# Altium schematic symbol library 13-Logicold 逻辑 IC.SchLib: 297 symbols (part 9 of 30)
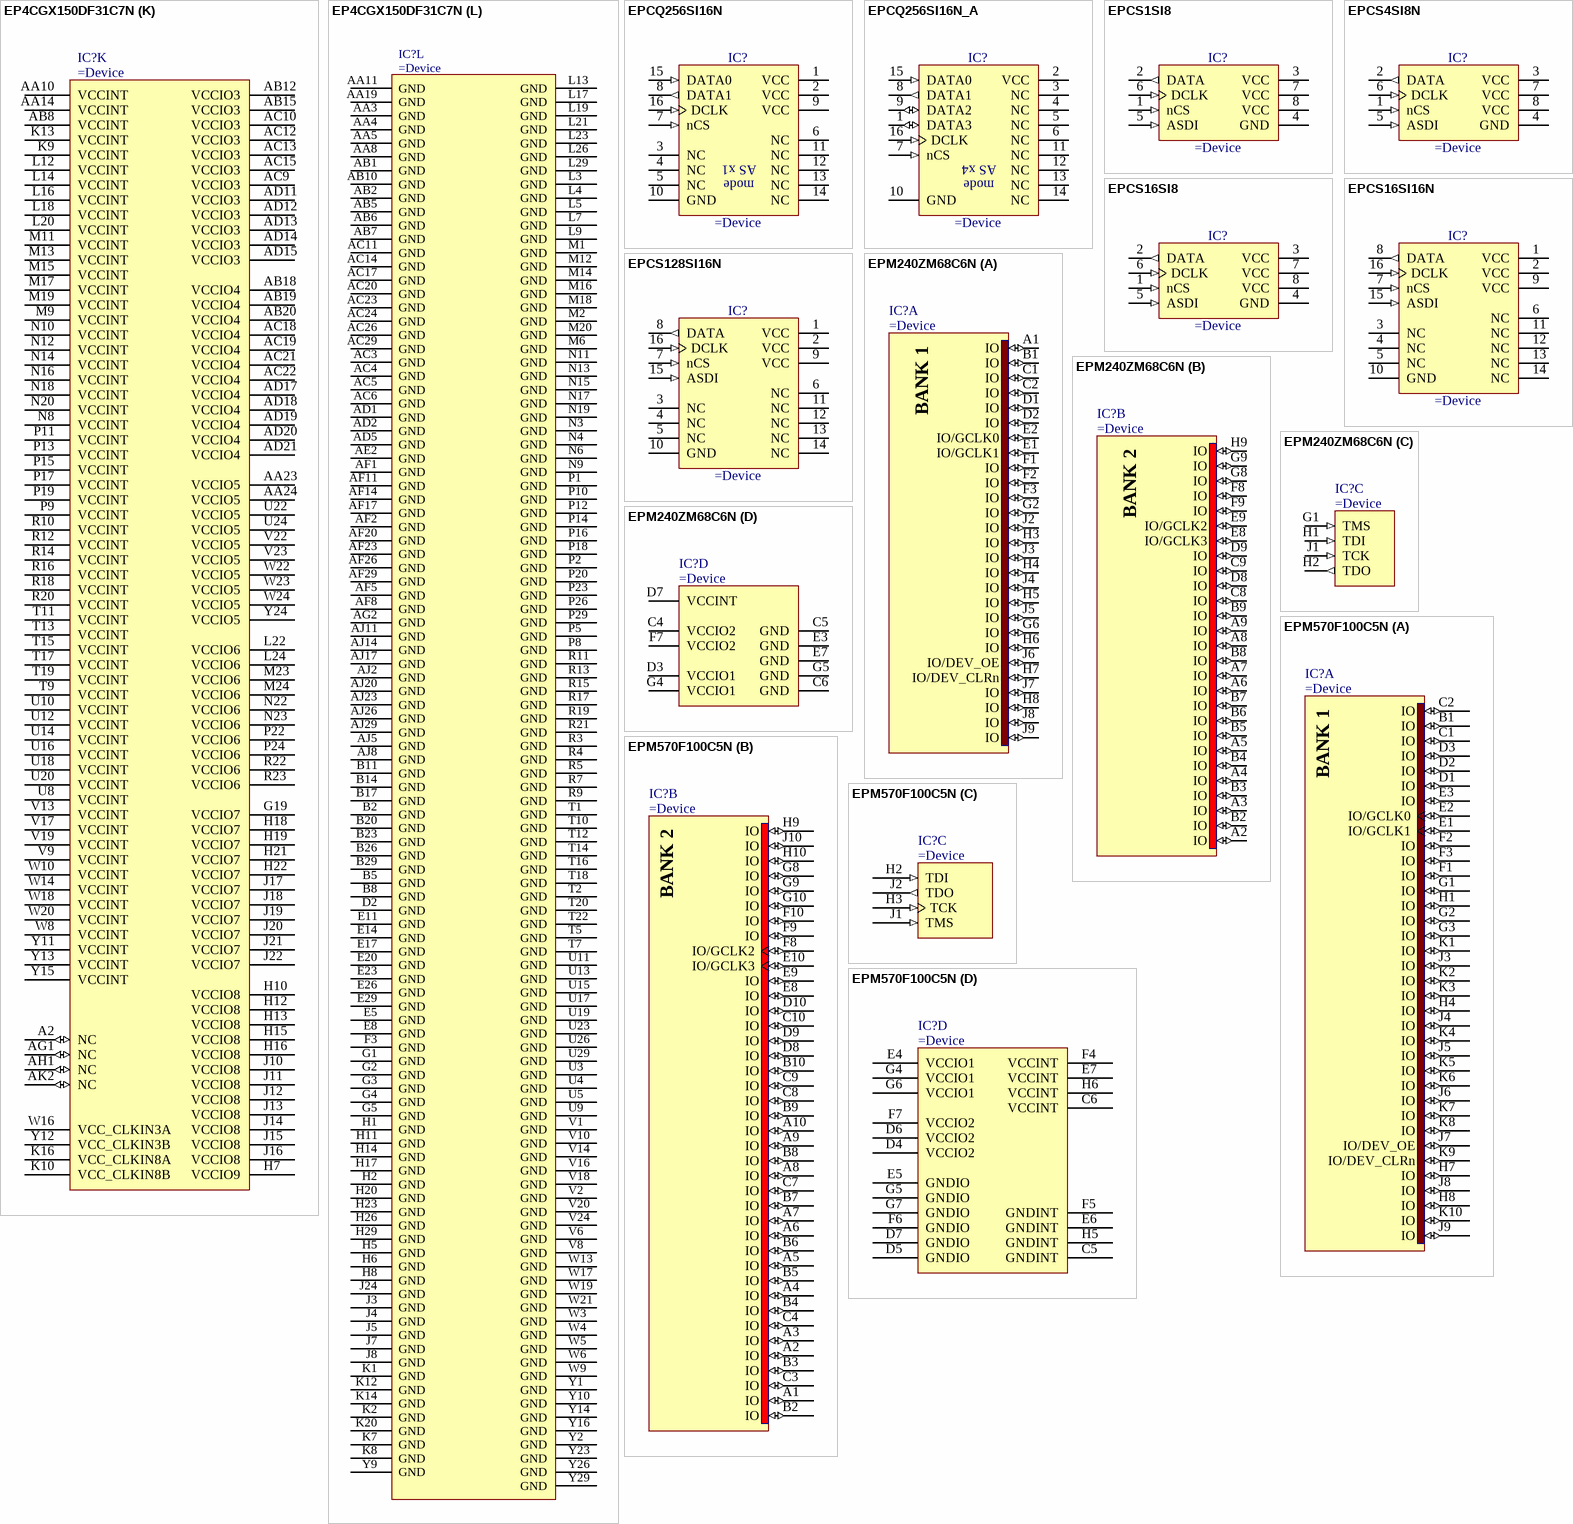
[diagram p170: symbols EP4CGX150DF31C7N to EPM570F100C5N]

## EP4CGX150DF31C7N
designator IC?
Cyclone IV GX Family FPGA, 475 I/O Pins, 8 Transceiver, 896-Pin FBGA, Speed Grade 7, Commercial Grade, Pb-Free
part A pins: AA12 IO/DIFFIO_B20P (io), AA13 IO/DIFFIO_B23P (io), AA15 IO/DIFFIO_B30P/DQ5B (io), AA16 IO/DIFFIO_B25P (io), AB11 IO/DIFFIO_B20N (io), AB13 IO/DIFFIO_B23N/DM5B/BWS#5B (io), AB14 IO/DIFFIO_B30N (io), AB16 IO/DIFFIO_B25N/DQ5B (io), AD6 IO/DIFFIO_B1P/CRC_ERROR (io), AD9 IO/DIFFIO_B7P/DQS1B/CQ1B#,DPCLK0 (io), AD10 IO/DIFFIO_B7N (io), AE3 IO/DIFFIO_B5P/DM1B (io), AE4 IO/DIFFIO_B2P/DATA5 (io), AE5 IO/DIFFIO_B2N/DATA6 (io), AE6 IO/PLL1_CLKOUTP (io), AE7 IO/DIFFIO_B1N/NCEO (io), AE9 IO/PLL6_CLKOUTP (io), AE10 IO/DIFFIO_B3P/DATA7 (io), AE12 IO/DIFFIO_B14P/DQ3B (io), AE13 IO/DIFFIO_B16P/DQ3B (io), AE14 IO/DIFFIO_B31P/DQ5B (io), AE15 IO/DIFFIO_B31N (io), AF3 IO/DIFFIO_B5N/DQ1B (io), AF4 IO/DIFFIO_B4P (io), AF6 IO/PLL1_CLKOUTN (io), AF7 IO/PLL5_CLKOUTP (io), AF9 IO/PLL6_CLKOUTN (io), AF10 IO/DIFFIO_B3N (io), AF12 IO/DIFFIO_B14N (io), AF13 IO/DIFFIO_B16N (io), AF15 IO/DIFFIO_B32P/DQS5B/CQ5B#,DPCLK2 (io), AG3 IO/DIFFIO_B6P (io), AG4 IO/DIFFIO_B4N (io), AG5 IO/DIFFIO_B10P/DQ1B (io), AG6 IO/PLL5_CLKOUTN (io), AG7 IO/DIFFIO_B24P (io), AG8 IO/DIFFIO_B22P (io), AG9 IO/DIFFIO_B15P/DQ3B (io), AG10 IO/DIFFIO_B17P/DQ3B (io), AG12 IO/DIFFIO_B19P (io), AG13 IO/DIFFIO_B21P/DQ3B (io), AG14 IO/DIFFIO_B26P (io), AG15 IO/DIFFIO_B32N (io), AH2 IO/DIFFIO_B8P/DQ1B (io), AH3 IO/DIFFIO_B6N (io), AH4 IO/DIFFIO_B9P (io), AH5 IO/DIFFIO_B10N (io), AH6 IO/DIFFIO_B12P/DQ1B (io), AH7 IO/DIFFIO_B24N (io), AH8 IO/DIFFIO_B22N/DQ3B (io), AH9 IO/DIFFIO_B15N (io), AH10 IO/DIFFIO_B17N (io), AH11 IO/DIFFIO_B18P/DQ3B (io), AH12 IO/DIFFIO_B19N/DQ3B (io), AH13 IO/DIFFIO_B21N/DQS3B/CQ3B#,DPCLK1 (io), AH14 IO/DIFFIO_B26N (io), AH15 IO/DIFFIO_B35P/DQ5B (io), AH16 IO/DIFFIO_B35N/DQ5B (io), AJ3 IO/DIFFIO_B8N/DQ1B (io), AJ4 IO/DIFFIO_B9N/DQ1B (io), AJ6 IO/DIFFIO_B12N/DM3B/BWS#3B (io), AJ7 IO/DIFFIO_B27P/DQ5B (io), AJ9 IO/DIFFIO_B28P (io), AJ10 IO/DIFFIO_B18N/DQ3B (io), AJ12 IO/DIFFIO_B34P (io), AJ13 IO/DIFFIO_B36P (io), AK3 IO/DIFFIO_B11P (io), AK4 IO/DIFFIO_B11N/DQ1B (io), AK5 IO/DIFFIO_B13P/DQ1B (io), AK6 IO/DIFFIO_B13N (io), AK7 IO/DIFFIO_B27N (io), AK8 IO/DIFFIO_B28N/DQ5B (io), AK9 IO/DIFFIO_B29P (io), AK10 IO/DIFFIO_B29N (io), AK11 IO/DIFFIO_B33P/DQ5B (io), AK12 IO/DIFFIO_B33N (io), AK13 IO/DIFFIO_B34N (io), AK14 IO/DIFFIO_B36N/DQ5B (io)
part B pins: AA17 IO/DIFFIO_B37N/DQS4B/CQ5B,DPCLK3 (io), AA18 IO/DIFFIO_B49N (io), AA20 IO/DIFFIO_B54N/DQ2B (io), AA21 IO/DIFFIO_B69P/DQ0B (io), AB22 IO/DIFFIO_B69N/DQS0B/CQ1B,DPCLK5 (io), AD16 IO/DIFFIO_B40P (io), AD22 IO/DIFFIO_B58P/DQS2B/CQ3B,DPCLK4 (io), AD23 IO/DIFFIO_B71P (io), AD24 IO/RUP2/DQ0B (io), AE16 IO/DIFFIO_B40N (io), AE17 IO/DIFFIO_B41P (io), AE18 IO/DIFFIO_B46P/DQ4B (io), AE19 IO/DIFFIO_B46N/DM2B (io), AE20 IO/DIFFIO_B55P (io), AE21 IO/DIFFIO_B55N/DQ2B (io), AE22 IO/DIFFIO_B58N (io), AE23 IO/DIFFIO_B71N (io), AE24 IO/RDN2/DQ0B (io), AF16 IO/DIFFIO_B38P (io), AF18 IO/DIFFIO_B41N (io), AF19 IO/DIFFIO_B48P (io), AF21 IO/DIFFIO_B57P (io), AF22 IO/DIFFIO_B57N (io), AF24 IO/PLL3_CLKOUTP (io), AF25 IO/PLL3_CLKOUTN (io), AG16 IO/DIFFIO_B38N (io), AG17 IO/DIFFIO_B44P (io), AG18 IO/DIFFIO_B47P (io), AG19 IO/DIFFIO_B48N (io), AG20 IO/DIFFIO_B52P (io), AG22 IO/DIFFIO_B56P (io), AG23 IO/DIFFIO_B61P/DQ2B (io), AG24 IO/DIFFIO_B65P (io), AG25 IO/DQ0B (io), AG26 IO/DIFFIO_B68P (io), AG27 IO/DIFFIO_B70P (io), AG28 IO/DIFFIO_B72P/DQ0B (io), AH17 IO/DIFFIO_B44N (io), AH18 IO/DIFFIO_B43P/DQ4B (io), AH19 IO/DIFFIO_B47N/DQ4B (io), AH20 IO/DIFFIO_B52N (io), AH21 IO/DIFFIO_B53P (io), AH22 IO/DIFFIO_B56N (io), AH23 IO/DIFFIO_B61N (io), AH24 IO/DIFFIO_B65N (io), AH25 IO/DIFFIO_B63P/DQ2B (io), AH26 IO/DIFFIO_B68N (io), AH27 IO/DIFFIO_B70N/DQ0B (io), AH28 IO/DIFFIO_B72N (io), AJ15 IO/DIFFIO_B39P/DQ4B (io), AJ18 IO/DIFFIO_B43N/DQ4B (io), AJ19 IO/DIFFIO_B45P (io), AJ21 IO/DIFFIO_B53N (io), AJ22 IO/DIFFIO_B51P (io), AJ24 IO/DIFFIO_B60P/DQ2B (io), AJ25 IO/DIFFIO_B63N (io), AJ27 IO/DIFFIO_B64P/DM0B (io), AJ28 IO/DIFFIO_B66P (io), AK15 IO/DIFFIO_B39N/DQ4B (io), AK17 IO/DIFFIO_B42P/DQ4B (io), AK18 IO/DIFFIO_B42N/DQ4B (io), AK19 IO/DIFFIO_B45N (io), AK20 IO/DIFFIO_B50P (io), AK21 IO/DIFFIO_B50N (io), AK22 IO/DIFFIO_B51N (io), AK23 IO/DIFFIO_B59P/DQ2B (io), AK24 IO/DIFFIO_B59N (io), AK25 IO/DIFFIO_B60N (io), AK26 IO/DIFFIO_B62P/DQ2B (io), AK27 IO/DIFFIO_B62N (io), AK28 IO/DIFFIO_B64N (io), AK29 IO/DIFFIO_B66N (io), Y17 IO/DIFFIO_B37P/DM4B (io), Y18 IO/DIFFIO_B49P (io), Y19 IO/DIFFIO_B54P/DQ2B (io), Y20 IO/DIFFIO_B67P/DQ0B (io), Y21 IO/DIFFIO_B67N/DQ0B (io)
part C pins: AA22 IO/DIFFIO_R50P/DQS3R/CQ3R#,DPCLK7 (io), AA25 IO/DIFFIO_R60N/DQ5R (io), AA27 IO/DIFFIO_R56P/DQ5R (io), AA28 IO/DIFFIO_R45P (io), AA29 IO/DIFFIO_R44N/DM1R (io), AA30 IO/DIFFIO_R43P (io), AB25 IO/DIFFIO_R60P/DQ5R (io), AB26 IO/DIFFIO_R61N/DM5R/BWS#5R (io), AB27 IO/DIFFIO_R48P (io), AB28 IO/DIFFIO_R48N/DQ3R (io), AB29 IO/DIFFIO_R44P (io), AB30 IO/DIFFIO_R46N/DQ3R (io), AC25 IO/DIFFIO_R61P/DQS5R/CQ5R#,DPCLK6 (io), AC27 IO/DIFFIO_R49P (io), AC28 IO/DIFFIO_R49N/DQ3R (io), AC30 IO/DIFFIO_R46P (io), AD25 IO/RUP3 (io), AD26 IO/RDN3 (io), AD27 IO/DIFFIO_R51P/DQ3R (io), AD28 IO/DIFFIO_R51N (io), AD29 IO/DIFFIO_R47P (io), AD30 IO/DIFFIO_R47N/DQ3R (io), AE25 IO/DIFFIO_R59P (io), AE26 IO/DIFFIO_R59N/DQ5R (io), AE27 IO/DIFFIO_R53P/DQ3R (io), AE28 IO/DIFFIO_R53N/DQ3R (io), AE29 IO/DIFFIO_R52P/DQ3R (io), AE30 IO/DIFFIO_R52N (io), AF27 IO/DIFFIO_R55P/DEV_CLRN (io), AF28 IO/DIFFIO_R55N/DEV_OE (io), AF30 IO/DIFFIO_R54N/DQ5R (io), AG29 IO/DIFFIO_R57N/DQ5R (io), AG30 IO/DIFFIO_R54P/DM3R/BWS#3R (io), AH29 IO/DIFFIO_R57P/DQ5R (io), AH30 IO/DIFFIO_R58N (io), AJ30 IO/DIFFIO_R58P (io), T21 IO/DIFFIO_R42N/DQ1R (io), T23 IO/DIFFIO_R34P/DQ1R (io), T24 IO/DIFFIO_R34N/DQ1R (io), T25 IO/DIFFIO_R40N (io), T26 IO/DIFFIO_R33P (io), T27 IO/DIFFIO_R33N (io), U21 IO/DIFFIO_R42P (io), U25 IO/DIFFIO_R40P/DQ1R (io), U27 IO/DIFFIO_R35P (io), U28 IO/DIFFIO_R35N (io), V25 IO/DIFFIO_R41P (io), V26 IO/DIFFIO_R41N (io), V27 IO/DIFFIO_R36P/DQ1R (io), V28 IO/DIFFIO_R36N/DQ1R (io), W25 IO/DIFFIO_R39P/DQ1R (io), W26 IO/DIFFIO_R39N (io), W27 IO/DIFFIO_R38P/DQS1R/CQ1R#,DPCLK8 (io), W28 IO/DIFFIO_R38N (io), W29 IO/DIFFIO_R37P (io), W30 IO/DIFFIO_R37N (io), Y22 IO/DIFFIO_R50N/DQ3R (io), Y25 IO/DQ5R (io), Y27 IO/DIFFIO_R56N/DQ5R (io), Y28 IO/DIFFIO_R45N (io), Y30 IO/DIFFIO_R43N/DQ1R (io)
part D pins: C29 IO/DIFFIO_R7P/DQ4R (io), C30 IO/DIFFIO_R7N/DM4R (io), D29 IO/DIFFIO_R9P/DQ2R (io), D30 IO/DIFFIO_R9N (io), E27 IO/DIFFIO_R3P/DQ4R (io), E28 IO/DIFFIO_R3N/DQ4R (io), E30 IO/DIFFIO_R13N/DQ2R (io), F26 IO/DIFFIO_R1P/DQ4R (io), F27 IO/DIFFIO_R1N/DQ4R (io), F28 IO/DIFFIO_R4P (io), F29 IO/DIFFIO_R4N (io), F30 IO/DIFFIO_R13P/DQ2R (io), G26 IO/DIFFIO_R2P/DQS4R/CQ5R,DPCLK11 (io), G27 IO/DIFFIO_R2N (io), G28 IO/DIFFIO_R12P (io), G29 IO/DIFFIO_R12N (io), G30 IO/DIFFIO_R19N (io), H25 IO/DIFFIO_R6N/DQ4R (io), H27 IO/DIFFIO_R5N/DQ4R (io), H28 IO/DIFFIO_R8N (io), H30 IO/DIFFIO_R19P/DQ2R (io), J25 IO/DIFFIO_R6P (io), J26 IO/DIFFIO_R10N/DQS2R/CQ3R,DPCLK10 (io), J27 IO/DIFFIO_R5P/DQ4R (io), J28 IO/DIFFIO_R8P (io), J29 IO/DIFFIO_R18P (io), J30 IO/DIFFIO_R18N (io), K25 IO/DIFFIO_R10P/DQ2R (io), K26 IO/DIFFIO_R11P/DQ2R (io), K27 IO/DIFFIO_R11N/DQ2R (io), K28 IO/DIFFIO_R17P (io), K29 IO/DIFFIO_R17N (io), K30 IO/DIFFIO_R20N (io), L27 IO/DIFFIO_R15P/DQ2R (io), L28 IO/DIFFIO_R15N (io), L30 IO/DIFFIO_R20P (io), M21 IO/DIFFIO_R14P (io), M22 IO/DIFFIO_R14N (io), M25 IO/DIFFIO_R22N (io), M26 IO/DIFFIO_R24N (io), M27 IO/DIFFIO_R21P (io), M28 IO/DIFFIO_R21N/DQ0R (io), M29 IO/DIFFIO_R23P/DQ0R (io), M30 IO/DIFFIO_R23N (io), N21 IO/DIFFIO_R16N (io), N24 IO/DIFFIO_R22P (io), N25 IO/DIFFIO_R24P/DQ0R (io), N27 IO/DIFFIO_R25P/DQ0R (io), N28 IO/DIFFIO_R25N (io), N29 IO/DIFFIO_R27P (io), N30 IO/DIFFIO_R27N (io), P21 IO/DIFFIO_R16P/DM2R (io), P25 IO/DIFFIO_R26N (io), P27 IO/DIFFIO_R28P (io), P28 IO/DIFFIO_R28N (io), P30 IO/DIFFIO_R29N/DQS0R/CQ1R,DPCLK9 (io), R24 IO/DIFFIO_R26P/DQ0R (io), R25 IO/DIFFIO_R31P (io), R26 IO/DIFFIO_R31N (io), R27 IO/DIFFIO_R30P/DQ0R (io), R28 IO/DIFFIO_R30N/DQ0R (io), R29 IO/DIFFIO_R32N/DM0R (io), R30 IO/DIFFIO_R29P (io), T28 IO/DIFFIO_R32P/DQ0R (io)
part E pins: A16 IO/DIFFIO_T36N (io), A17 IO/DIFFIO_T39N/DQ4T (io), A18 IO/DIFFIO_T39P (io), A19 IO/DIFFIO_T42N (io), A20 IO/DIFFIO_T44N (io), A21 IO/DIFFIO_T48N (io), A22 IO/DIFFIO_T51N (io), A23 IO/DIFFIO_T51P/DQ4T (io), A24 IO/DIFFIO_T54N/DM2T (io), A25 IO/DIFFIO_T59N (io), A26 IO/DIFFIO_T59P/DQ2T (io), A27 IO/DIFFIO_T62N (io), A28 IO/DIFFIO_T63N (io), A29 IO/DIFFIO_T65N/DQS0T/CQ1T,DPCLK12 (io), B16 IO/DIFFIO_T36P/DM4T (io), B18 IO/DIFFIO_T42P (io), B19 IO/DIFFIO_T44P (io), B21 IO/DIFFIO_T48P (io), B22 IO/DIFFIO_T49N (io), B24 IO/DIFFIO_T53N (io), B25 IO/DIFFIO_T54P (io), B27 IO/DIFFIO_T62P/DQ2T (io), B28 IO/DIFFIO_T63P/DQ2T (io), B30 IO/DIFFIO_T65P/DQ0T (io), C17 IO/DIFFIO_T38N (io), C18 IO/DIFFIO_T41N/DQ4T (io), C19 IO/DIFFIO_T43N (io), C20 IO/DIFFIO_T46N (io), C22 IO/DIFFIO_T49P/DQ4T (io), C23 IO/DIFFIO_T52N (io), C24 IO/DIFFIO_T53P (io), C25 IO/DIFFIO_T58N (io), C26 IO/DIFFIO_T60N (io), C27 IO/PLL4_CLKOUTN (io), C28 IO/DIFFIO_T69N/DQ0T (io), D17 IO/DIFFIO_T38P (io), D18 IO/DIFFIO_T41P (io), D19 IO/DIFFIO_T43P/DQ4T (io), D20 IO/DIFFIO_T46P (io), D21 IO/DIFFIO_T56N/DQ2T (io), D22 IO/DIFFIO_T57N/DQ2T (io), D23 IO/DIFFIO_T52P (io), D24 IO/DIFFIO_T61N (io), D25 IO/DIFFIO_T58P (io), D26 IO/DIFFIO_T60P/DQ2T (io), D27 IO/PLL4_CLKOUTP (io), D28 IO/DIFFIO_T69P/DQ0T (io), E18 IO/DIFFIO_T45N/DQ4T (io), E19 IO/DIFFIO_T45P/DQ4T (io), E21 IO/DIFFIO_T56P (io), E22 IO/DIFFIO_T57P (io), E24 IO/DIFFIO_T61P/DQ2T (io), E25 IO (io), F17 IO/DIFFIO_T47N (io), F18 IO/DIFFIO_T40N (io), F19 IO/DIFFIO_T55N/DQ2T (io), F20 IO/DIFFIO_T50N (io), F21 IO/DIFFIO_T50P (io), F22 IO/DIFFIO_T64N/DQ0T (io), F23 IO/DIFFIO_T66N/DQ0T (io), F24 IO (io), F25 IO/RDN4 (io), G17 IO/DIFFIO_T47P/DQS2T/CQ3T,DPCLK13 (io), G18 IO/DIFFIO_T40P (io), G20 IO/DIFFIO_T55P (io), G22 IO/DIFFIO_T64P/DM0T (io), G23 IO/DIFFIO_T66P/DQ0T (io), G24 IO/DIFFIO_T68N/DQ0T (io), G25 IO/RUP4 (io), H24 IO/DIFFIO_T68P/DQ0T (io), K17 IO (io), K18 IO/DIFFIO_T37N/DQ4T (io), K19 IO/DIFFIO_T37P/DQS4T/CQ5T,DPCLK14 (io), K21 IO/DIFFIO_T67P (io), K22 IO/DIFFIO_T67N (io)
part F pins: A5 IO/DIFFIO_T16N/DM3T/BWS#3T (io), A6 IO/DIFFIO_T16P (io), A7 IO/DIFFIO_T18N (io), A8 IO/DIFFIO_T20N/DM5T (io), A9 IO/DIFFIO_T19N (io), A10 IO/DIFFIO_T27N (io), A11 IO/DIFFIO_T27P (io), A12 IO/DIFFIO_T29N/DQ5T (io), A13 IO/DIFFIO_T32N/DQ5T (io), A14 IO/DIFFIO_T32P/DQ5T (io), B6 IO/DIFFIO_T18P/DQ3T (io), B7 IO/DIFFIO_T20P (io), B9 IO/DIFFIO_T19P/DQ3T (io), B10 IO/DIFFIO_T23N (io), B12 IO/DIFFIO_T29P (io), C2 IO/DIFFIO_T4N/DATA4/DM1T/BWS#1T (io), C3 IO/DIFFIO_T8N/DQ1T (io), C4 IO/DIFFIO_T13N (io), C5 IO/DIFFIO_T12N/DQ3T (io), C6 IO/DIFFIO_T12P (io), C7 IO/DIFFIO_T11N/DQ3T (io), C9 IO/DIFFIO_T6N/DQ1T (io), C10 IO/DIFFIO_T23P (io), C11 IO/DIFFIO_T17N (io), C12 IO/DIFFIO_T21N (io), C13 IO/DIFFIO_T25N (io), C14 IO/DIFFIO_T26N/DQ5T (io), C15 IO/DIFFIO_T28N (io), C16 IO/DIFFIO_T34N/DQS5T/CQ5T#,DPCLK15 (io), D1 IO/DIFFIO_T4P/DATA3 (io), D3 IO/DIFFIO_T8P/DQ1T (io), D4 IO/DIFFIO_T13P/DQ3T (io), D5 IO/DIFFIO_T10N/DQ3T (io), D6 IO/DIFFIO_T11P/DQ3T (io), D7 IO/DIFFIO_T15N/DQS3T/CQ3T#,DPCLK16 (io), D8 IO (io), D9 IO/DIFFIO_T6P/DQ1T (io), D10 IO/DIFFIO_T7N/DQ1T (io), D11 IO/DIFFIO_T17P/DQ3T (io), D12 IO/DIFFIO_T21P (io), D13 IO/DIFFIO_T25P (io), D14 IO/DIFFIO_T26P (io), D15 IO/DIFFIO_T28P/DQ5T (io), D16 IO/DIFFIO_T34P/DQ5T (io), E3 IO/DIFFIO_T3N (io), E4 IO/DIFFIO_T3P (io), E6 IO/DIFFIO_T10P/DQ1T (io), E7 IO/DIFFIO_T15P (io), E9 IO/DIFFIO_T5N (io), E10 IO/DIFFIO_T7P/DQ1T (io), E12 IO/DIFFIO_T14N (io), E13 IO/DIFFIO_T24N (io), E15 IO/DIFFIO_T30N (io), E16 IO/DIFFIO_T31N (io), F4 IO/DIFFIO_T2N (io), F5 IO/DIFFIO_T2P (io), F6 IO/PLL2_CLKOUTN (io), F7 IO/PLL7_CLKOUTN (io), F8 IO/PLL8_CLKOUTN (io), F9 IO/DIFFIO_T5P/DQ1T (io), F10 IO/DIFFIO_T9N/DQ1T (io), F11 IO/DIFFIO_T14P/DQ3T (io), F12 IO/DIFFIO_T22N/DQ5T (io), F13 IO/DIFFIO_T24P/DQ5T (io), F14 IO/DIFFIO_T30P (io), F15 IO/DIFFIO_T31P (io), F16 IO/DIFFIO_T35N (io), G6 IO/PLL2_CLKOUTP (io), G7 IO/PLL7_CLKOUTP (io), G8 IO/PLL8_CLKOUTP (io), G10 IO/DIFFIO_T9P/DQS1T/CQ1T#,DPCLK17 (io), G12 IO/DIFFIO_T22P (io), G13 IO/DIFFIO_T33N (io), G14 IO/DIFFIO_T33P (io), G15 IO/DIFFIO_T35P (io), H9 IO/DIFFIO_T1N/DATA2 (io), J9 IO/DIFFIO_T1P (io)
part G pins: A15 CLKIO8/DIFFCLK_5N (io), AA1 GXB_RX1N (io), AA2 GXB_RX1P (io), AB3 GXB_TX0N (io), AB4 GXB_TX0P (io), AC1 GXB_RX0N (io), AC2 GXB_RX0P (io), AE1 RREF0 (io), AJ16 CLKIO14/DIFFCLK_6P (io), AK16 CLKIO15/DIFFCLK_6N (io), B15 CLKIO9/DIFFCLK_5P (io), H3 GXB_TX7N (io), H4 GXB_TX7P (io), J1 GXB_RX7N (io), J2 GXB_RX7P (io), K3 GXB_TX6N (io), K4 GXB_TX6P (io), K11 REFCLK4N/DIFFCLK_8N (io), K15 CLKIO10/DIFFCLK_4N,REFCLK3N (io), L1 GXB_RX6N (io), L2 GXB_RX6P (io), L10 REFCLK5N/DIFFCLK_9N (io), L11 REFCLK4P/DIFFCLK_8P,CLKIO17 (io), L15 CLKIO11/DIFFCLK_4P,REFCLK3P (io), M3 GXB_TX5N (io), M4 GXB_TX5P (io), M10 REFCLK5P/DIFFCLK_9P,CLKIO19 (io), N1 GXB_RX5N (io), N2 GXB_RX5P (io), P3 GXB_TX4N (io), P4 GXB_TX4P (io), R1 GXB_RX4N (io), R2 GXB_RX4P (io), T3 GXB_TX3N (io), T4 GXB_TX3P (io), T29 CLKIO7/DIFFCLK_3P (io), T30 CLKIO6/DIFFCLK_3N (io), U1 GXB_RX3N (io), U2 GXB_RX3P (io), V3 GXB_TX2N (io), V4 GXB_TX2P (io), V11 REFCLK0P/DIFFCLK_0P,CLKIO20 (io), V12 REFCLK1P/DIFFCLK_1P,CLKIO22 (io), V15 CLKIO12/DIFFCLK_7P,REFCLK2P (io), V29 CLKIO5/DIFFCLK_2P (io), V30 CLKIO4/DIFFCLK_2N (io), W1 GXB_RX2N (io), W2 GXB_RX2P (io), W11 REFCLK0N/DIFFCLK_0N (io), W12 REFCLK1N/DIFFCLK_1N (io), W15 CLKIO13/DIFFCLK_7N,REFCLK2N (io), Y3 GXB_TX1N (io), Y4 GXB_TX1P (io)
part H pins: AA26 VREFB5N2 (io), AB17 VREFB4N2 (io), AB21 VREFB4N0 (io), AC16 VREFB3N0 (io), AE11 VREFB3N2 (io), AG11 VREFB3N1 (io), AG21 VREFB4N1 (io), B13 VREFB8N0 (io), C8 VREFB8N2 (io), C21 VREFB7N1 (io), G11 VREFB8N1 (io), G16 VREFB7N2 (io), G21 VREFB7N0 (io), K24 VREFB6N0 (io), L25 VREFB6N1 (io), N26 VREFB6N2 (io), U30 VREFB5N0 (io), V21 VREFB5N1 (io)
part I pins: A3 DATA0 (io), A4 CLKUSR (io), AB9 CONF_DONE (io), AC7 MSEL2 (io), AC8 MSEL3 (io), AD7 MSEL0 (io), AD8 MSEL1 (io), AE8 INIT_DONE (io), AJ1 nSTATUS (io), B1 nCONFIG (io), B3 DCLK (io), B4 nCSO (io), C1 nCE (io), E1 TMS (io), E2 TDI (io), F1 TDO (io), F2 TCK (io), G9 DATA1,ASDO (io)
part J pins: AA6 VCCL_GXB (power), AA7 VCCA (power), AA9 VCCA (power), AB23 VCCD_PLL (power), AB24 VCCA (power), AD3 VCCA_GXB (power), AD4 VCCL_GXB (power), J6 VCCA (power), J23 VCCD_PLL (power), K5 VCCL_GXB (power), K6 VCCD_PLL (power), K23 VCCA (power), L6 VCCH_GXB (power), L8 VCCA (power), M5 VCCL_GXB (power), M7 VCCA_GXB (power), M8 VCCD_PLL (power), N5 VCCH_GXB (power), N7 VCCL_GXB (power), P6 VCCL_GXB (power), P7 VCCD_PLL (power), R6 VCCA_GXB (power), R8 VCCA (power), T6 VCCL_GXB (power), T8 VCCA (power), U6 VCCH_GXB (power), U7 VCCD_PLL (power), V5 VCCL_GXB (power), V7 VCCA_GXB (power), W7 VCCH_GXB (power), Y5 VCCL_GXB (power), Y6 VCCA_GXB (power), Y7 VCCD_PLL (power), Y8 VCCD_PLL (power)
part K pins: A2 NC (io), AA10 VCCINT (power), AA14 VCCINT (power), AA23 VCCIO5 (power), AA24 VCCIO5 (power), AB8 VCCINT (power), AB12 VCCIO3 (power), AB15 VCCIO3 (power), AB18 VCCIO4 (power), AB19 VCCIO4 (power), AB20 VCCIO4 (power), AC9 VCCIO3 (power), AC10 VCCIO3 (power), AC12 VCCIO3 (power), AC13 VCCIO3 (power), AC15 VCCIO3 (power), AC18 VCCIO4 (power), AC19 VCCIO4 (power), AC21 VCCIO4 (power), AC22 VCCIO4 (power), AD11 VCCIO3 (power), AD12 VCCIO3 (power), AD13 VCCIO3 (power), AD14 VCCIO3 (power), AD15 VCCIO3 (power), AD17 VCCIO4 (power), AD18 VCCIO4 (power), AD19 VCCIO4 (power), AD20 VCCIO4 (power), AD21 VCCIO4 (power), AG1 NC (io), AH1 NC (io), AK2 NC (io), G19 VCCIO7 (power), H7 VCCIO9 (power), H10 VCCIO8 (power), H12 VCCIO8 (power), H13 VCCIO8 (power), H15 VCCIO8 (power), H16 VCCIO8 (power), H18 VCCIO7 (power), H19 VCCIO7 (power), H21 VCCIO7 (power), H22 VCCIO7 (power), J10 VCCIO8 (power), J11 VCCIO8 (power), J12 VCCIO8 (power), J13 VCCIO8 (power), J14 VCCIO8 (power), J15 VCCIO8 (power), J16 VCCIO8 (power), J17 VCCIO7 (power), J18 VCCIO7 (power), J19 VCCIO7 (power), J20 VCCIO7 (power), J21 VCCIO7 (power), J22 VCCIO7 (power), K9 VCCINT (power), K10 VCC_CLKIN8B (power), K13 VCCINT (power), K16 VCC_CLKIN8A (power), L12 VCCINT (power), L14 VCCINT (power), L16 VCCINT (power), L18 VCCINT (power), L20 VCCINT (power), L22 VCCIO6 (power), L24 VCCIO6 (power), M9 VCCINT (power), M11 VCCINT (power), M13 VCCINT (power), M15 VCCINT (power), M17 VCCINT (power), M19 VCCINT (power), M23 VCCIO6 (power), M24 VCCIO6 (power), N8 VCCINT (power), N10 VCCINT (power), N12 VCCINT (power), N14 VCCINT (power), N16 VCCINT (power), N18 VCCINT (power), N20 VCCINT (power), N22 VCCIO6 (power), N23 VCCIO6 (power), P9 VCCINT (power), P11 VCCINT (power), P13 VCCINT (power), P15 VCCINT (power), P17 VCCINT (power), P19 VCCINT (power), P22 VCCIO6 (power), P24 VCCIO6 (power), R10 VCCINT (power), R12 VCCINT (power), R14 VCCINT (power), R16 VCCINT (power), R18 VCCINT (power), R20 VCCINT (power), R22 VCCIO6 (power), R23 VCCIO6 (power), T9 VCCINT (power), T11 VCCINT (power), T13 VCCINT (power), T15 VCCINT (power), T17 VCCINT (power), T19 VCCINT (power), U8 VCCINT (power), U10 VCCINT (power), U12 VCCINT (power), U14 VCCINT (power), U16 VCCINT (power), U18 VCCINT (power), U20 VCCINT (power), U22 VCCIO5 (power), U24 VCCIO5 (power), V9 VCCINT (power), V13 VCCINT (power), V17 VCCINT (power), V19 VCCINT (power), V22 VCCIO5 (power), V23 VCCIO5 (power), W8 VCCINT (power), W10 VCCINT (power), W14 VCCINT (power), W16 VCC_CLKIN3A (power), W18 VCCINT (power), W20 VCCINT (power), W22 VCCIO5 (power), W23 VCCIO5 (power), W24 VCCIO5 (power), Y11 VCCINT (power), Y12 VCC_CLKIN3B (power), Y13 VCCINT (power), Y15 VCCINT (power), Y24 VCCIO5 (power)
part L pins: AA3 GND (power), AA4 GND (power), AA5 GND (power), AA8 GND (power), AA11 GND (power), AA19 GND (power), AB1 GND (power), AB2 GND (power), AB5 GND (power), AB6 GND (power), AB7 GND (power), AB10 GND (power), AC3 GND (power), AC4 GND (power), AC5 GND (power), AC6 GND (power), AC11 GND (power), AC14 GND (power), AC17 GND (power), AC20 GND (power), AC23 GND (power), AC24 GND (power), AC26 GND (power), AC29 GND (power), AD1 GND (power), AD2 GND (power), AD5 GND (power), AE2 GND (power), AF1 GND (power), AF2 GND (power), AF5 GND (power), AF8 GND (power), AF11 GND (power), AF14 GND (power), AF17 GND (power), AF20 GND (power), AF23 GND (power), AF26 GND (power), AF29 GND (power), AG2 GND (power), AJ2 GND (power), AJ5 GND (power), AJ8 GND (power), AJ11 GND (power), AJ14 GND (power), AJ17 GND (power), AJ20 GND (power), AJ23 GND (power), AJ26 GND (power), AJ29 GND (power), B2 GND (power), B5 GND (power), B8 GND (power), B11 GND (power), B14 GND (power), B17 GND (power), B20 GND (power), B23 GND (power), B26 GND (power), B29 GND (power), D2 GND (power), E5 GND (power), E8 GND (power), E11 GND (power), E14 GND (power), E17 GND (power), E20 GND (power), E23 GND (power), E26 GND (power), E29 GND (power), F3 GND (power), G1 GND (power), G2 GND (power), G3 GND (power), G4 GND (power), G5 GND (power), H1 GND (power), H2 GND (power), H5 GND (power), H6 GND (power), H8 GND (power), H11 GND (power), H14 GND (power), H17 GND (power), H20 GND (power), H23 GND (power), H26 GND (power), H29 GND (power), J3 GND (power), J4 GND (power), J5 GND (power), J7 GND (power), J8 GND (power), J24 GND (power), K1 GND (power), K2 GND (power), K7 GND (power), K8 GND (power), K12 GND (power), K14 GND (power), K20 GND (power), L3 GND (power), L4 GND (power), L5 GND (power), L7 GND (power), L9 GND (power), L13 GND (power), L17 GND (power), L19 GND (power), L21 GND (power), L23 GND (power), L26 GND (power), L29 GND (power), M1 GND (power), M2 GND (power), M6 GND (power), M12 GND (power), M14 GND (power), M16 GND (power), M18 GND (power), M20 GND (power), N3 GND (power), N4 GND (power), N6 GND (power), N9 GND (power), N11 GND (power), N13 GND (power), N15 GND (power), N17 GND (power), N19 GND (power), P1 GND (power), P2 GND (power), P5 GND (power), P8 GND (power), P10 GND (power), P12 GND (power), P14 GND (power), P16 GND (power), P18 GND (power), P20 GND (power), P23 GND (power), P26 GND (power), P29 GND (power), R3 GND (power), R4 GND (power), R5 GND (power), R7 GND (power), R9 GND (power), R11 GND (power), R13 GND (power), R15 GND (power), R17 GND (power), R19 GND (power), R21 GND (power), T1 GND (power), T2 GND (power), T5 GND (power), T7 GND (power), T10 GND (power), T12 GND (power), T14 GND (power), T16 GND (power), T18 GND (power), T20 GND (power), T22 GND (power), U3 GND (power), U4 GND (power), U5 GND (power), U9 GND (power), U11 GND (power), U13 GND (power), U15 GND (power), U17 GND (power), U19 GND (power), U23 GND (power), U26 GND (power), U29 GND (power), V1 GND (power), V2 GND (power), V6 GND (power), V8 GND (power), V10 GND (power), V14 GND (power), V16 GND (power), V18 GND (power), V20 GND (power), V24 GND (power), W3 GND (power), W4 GND (power), W5 GND (power), W6 GND (power), W9 GND (power), W13 GND (power), W17 GND (power), W19 GND (power), W21 GND (power), Y1 GND (power), Y2 GND (power), Y9 GND (power), Y10 GND (power), Y14 GND (power), Y16 GND (power), Y23 GND (power), Y26 GND (power), Y29 GND (power)
part A text: BANK 3
part B text: BANK 4
part C text: BANK 5
part D text: BANK 6
part E text: BANK 7
part F text: BANK 8

## EPCQ256SI16N
designator IC?
EPCQ Series, In-system programmable 3.3V serial configuration device, 16-Pin SOIC, 256-Megabit, Industrial Grade, Pb-Free
pins: 1 VCC (power) "3.3V supply", 2 VCC (power) "3.3V supply", 3 NC "Can be left floating, or connected to VCC or GND", 4 NC "Can be left floating, or connected to VCC or GND", 5 NC "Can be left floating, or connected to VCC or GND", 6 NC "Can be left floating, or connected to VCC or GND", 7 nCS (in) "Active low, chip select input", 8 DATA1 (out) "Serial data out", 9 VCC (power) "3.3V supply", 10 GND (power) "Ground", 11 NC "Can be left floating, or connected to VCC or GND", 12 NC "Can be left floating, or connected to VCC or GND", 13 NC "Can be left floating, or connected to VCC or GND", 14 NC "Can be left floating, or connected to VCC or GND", 15 DATA0 (in) "AS data in", 16 DCLK (in) "Provides timing of the serial interface"
text: AS x1; mode

## EPCQ256SI16N_A
designator IC?
EPCQ Series, In-system programmable 3.3V serial configuration device, 16-Pin SOIC, 256-Megabit, Industrial Grade, Pb-Free
pins: 1 DATA3 (io) "3.3V supply", 2 VCC (power) "3.3V supply", 3 NC "Can be left floating, or connected to VCC or GND", 4 NC "Can be left floating, or connected to VCC or GND", 5 NC "Can be left floating, or connected to VCC or GND", 6 NC "Can be left floating, or connected to VCC or GND", 7 nCS (in) "Active low, chip select input", 8 DATA1 (out) "Serial data out", 9 DATA2 (io) "3.3V supply", 10 GND (power) "Ground", 11 NC "Can be left floating, or connected to VCC or GND", 12 NC "Can be left floating, or connected to VCC or GND", 13 NC "Can be left floating, or connected to VCC or GND", 14 NC "Can be left floating, or connected to VCC or GND", 15 DATA0 (in) "AS data in", 16 DCLK (in) "Provides timing of the serial interface"
text: AS x4; mode

## EPCS1SI8
designator IC?
EPC3V Serial configuration device, 8-Pin SOIC, 1Mx1, Industrial Grade, Pb-Free
pins: 1 nCS (in) "Active low, chip select input", 2 DATA (out) "Serial data out", 3 VCC (power) "3.3V supply", 4 GND (power) "Ground", 5 ASDI (in) "AS data in", 6 DCLK (in) "Provides timing of the serial interface", 7 VCC (power) "3.3V supply", 8 VCC (power) "3.3V supply"

## EPCS4SI8N
designator IC?
EPCS4 Series, In-system programmable 3.3V serial configuration device, 8-Pin SOIC, 4-Megabit, Industrial Grade, Pb-Free
pins: 1 nCS (in) "Active low, chip select input", 2 DATA (out) "Serial data out", 3 VCC (power) "3.3V supply", 4 GND (power) "Ground", 5 ASDI (in) "AS data in", 6 DCLK (in) "Provides timing of the serial interface", 7 VCC (power) "3.3V supply", 8 VCC (power) "3.3V supply"

## EPCS16SI8
designator IC?
EPC3V Serial configuration device, 8-Pin SOIC, 16Mx1, Industrial Grade, Pb-Free
pins: 1 nCS (in) "Active low, chip select input", 2 DATA (out) "Serial data out", 3 VCC (power) "3.3V supply", 4 GND (power) "Ground", 5 ASDI (in) "AS data in", 6 DCLK (in) "Provides timing of the serial interface", 7 VCC (power) "3.3V supply", 8 VCC (power) "3.3V supply"

## EPCS16SI16N
designator IC?
EPCS16 Series, In-system programmable 3.3V serial configuration device, 16-Pin SOIC, 16-Megabit, Industrial Grade, Pb-Free
pins: 1 VCC (power) "3.3V supply", 2 VCC (power) "3.3V supply", 3 NC "Can be left floating, or connected to VCC or GND", 4 NC "Can be left floating, or connected to VCC or GND", 5 NC "Can be left floating, or connected to VCC or GND", 6 NC "Can be left floating, or connected to VCC or GND", 7 nCS (in) "Active low, chip select input", 8 DATA (out) "Serial data out", 9 VCC (power) "3.3V supply", 10 GND (power) "Ground", 11 NC "Can be left floating, or connected to VCC or GND", 12 NC "Can be left floating, or connected to VCC or GND", 13 NC "Can be left floating, or connected to VCC or GND", 14 NC "Can be left floating, or connected to VCC or GND", 15 ASDI (in) "AS data in", 16 DCLK (in) "Provides timing of the serial interface"

## EPCS128SI16N
designator IC?
EPCS Series, In-system programmable 3.3V serial configuration device, 16-Pin SOIC, 128-Megabit, Industrial Grade, Pb-Free
pins: 1 VCC (power) "3.3V supply", 2 VCC (power) "3.3V supply", 3 NC "Can be left floating, or connected to VCC or GND", 4 NC "Can be left floating, or connected to VCC or GND", 5 NC "Can be left floating, or connected to VCC or GND", 6 NC "Can be left floating, or connected to VCC or GND", 7 nCS (in) "Active low, chip select input", 8 DATA (out) "Serial data out", 9 VCC (power) "3.3V supply", 10 GND (power) "Ground", 11 NC "Can be left floating, or connected to VCC or GND", 12 NC "Can be left floating, or connected to VCC or GND", 13 NC "Can be left floating, or connected to VCC or GND", 14 NC "Can be left floating, or connected to VCC or GND", 15 ASDI (in) "AS data in", 16 DCLK (in) "Provides timing of the serial interface"

## EPM240ZM68C6N
designator IC?
MAX II Family, 1.8V, Instant-On, Non-Volatile CPLD, 54 User I/Os, 68-Pin FineLine BGA, Speed Grade 6, Pb-Free
part A pins: A1 IO (io), B1 IO (io), C1 IO (io), C2 IO (io), D1 IO (io), D2 IO (io), E1 IO/GCLK1 (io), E2 IO/GCLK0 (io), F1 IO (io), F2 IO (io), F3 IO (io), G2 IO (io), G6 IO (io), H3 IO (io), H4 IO (io), H5 IO (io), H6 IO (io), H7 IO/DEV_CLRn (io), H8 IO (io), J2 IO (io), J3 IO (io), J4 IO (io), J5 IO (io), J6 IO/DEV_OE (io), J7 IO (io), J8 IO (io), J9 IO (io)
part B pins: A2 IO (io), A3 IO (io), A4 IO (io), A5 IO (io), A6 IO (io), A7 IO (io), A8 IO (io), A9 IO (io), B2 IO (io), B3 IO (io), B4 IO (io), B5 IO (io), B6 IO (io), B7 IO (io), B8 IO (io), B9 IO (io), C8 IO (io), C9 IO (io), D8 IO (io), D9 IO (io), E8 IO/GCLK3 (io), E9 IO/GCLK2 (io), F8 IO (io), F9 IO (io), G8 IO (io), G9 IO (io), H9 IO (io)
part C pins: G1 TMS (in), H1 TDI (in), H2 TDO (out), J1 TCK (in)
part D pins: C4 VCCIO2 (power), C5 GND (power), C6 GND (power), D3 VCCIO1 (power), D7 VCCINT (power), E3 GND (power), E7 GND (power), F7 VCCIO2 (power), G4 VCCIO1 (power), G5 GND (power)
part A text: BANK 1
part B text: BANK 2

## EPM570F100C5N
designator IC?
MAX II 3.3/2.5V CPLD, 76 IOs, 570 Logic Elements, 100-Pin Fineline BGA, Commercial Temperature, Speed Grade 5, Pb-Free
part A pins: B1 IO (io), C1 IO (io), C2 IO (io), D1 IO (io), D2 IO (io), D3 IO (io), E1 IO/GCLK1 (io), E2 IO/GCLK0 (io), E3 IO (io), F1 IO (io), F2 IO (io), F3 IO (io), G1 IO (io), G2 IO (io), G3 IO (io), H1 IO (io), H4 IO (io), H7 IO (io), H8 IO (io), J3 IO (io), J4 IO (io), J5 IO (io), J6 IO (io), J7 IO/DEV_OE (io), J8 IO (io), J9 IO (io), K1 IO (io), K2 IO (io), K3 IO (io), K4 IO (io), K5 IO (io), K6 IO (io), K7 IO (io), K8 IO (io), K9 IO/DEV_CLRn (io), K10 IO (io)
part B pins: A1 IO (io), A2 IO (io), A3 IO (io), A4 IO (io), A5 IO (io), A6 IO (io), A7 IO (io), A8 IO (io), A9 IO (io), A10 IO (io), B2 IO (io), B3 IO (io), B4 IO (io), B5 IO (io), B6 IO (io), B7 IO (io), B8 IO (io), B9 IO (io), B10 IO (io), C3 IO (io), C4 IO (io), C7 IO (io), C8 IO (io), C9 IO (io), C10 IO (io), D8 IO (io), D9 IO (io), D10 IO (io), E8 IO (io), E9 IO (io), E10 IO/GCLK3 (io), F8 IO/GCLK2 (io), F9 IO (io), F10 IO (io), G8 IO (io), G9 IO (io), G10 IO (io), H9 IO (io), H10 IO (io), J10 IO (io)
part C pins: H2 TDI (in), H3 TCK (in), J1 TMS (in), J2 TDO (out)
part D pins: C5 GNDINT (power), C6 VCCINT (power), D4 VCCIO2 (power), D5 GNDIO (power), D6 VCCIO2 (power), D7 GNDIO (power), E4 VCCIO1 (power), E5 GNDIO (power), E6 GNDINT (power), E7 VCCINT (power), F4 VCCINT (power), F5 GNDINT (power), F6 GNDIO (power), F7 VCCIO2 (power), G4 VCCIO1 (power), G5 GNDIO (power), G6 VCCIO1 (power), G7 GNDIO (power), H5 GNDINT (power), H6 VCCINT (power)
